# Altium footprint library THU.PcbLib: 477 footprints (part 8 of 30)
Each footprint in its own frame and in the unit in brackets; x right, y up, seen from the top. Pads: shape width x height; smd on the part's side, far side on the other; paste and mask are expansions set on the pad; w line width, h text height; cw(c..) or ccw(c..) is an arc to the next point about the centre after c.
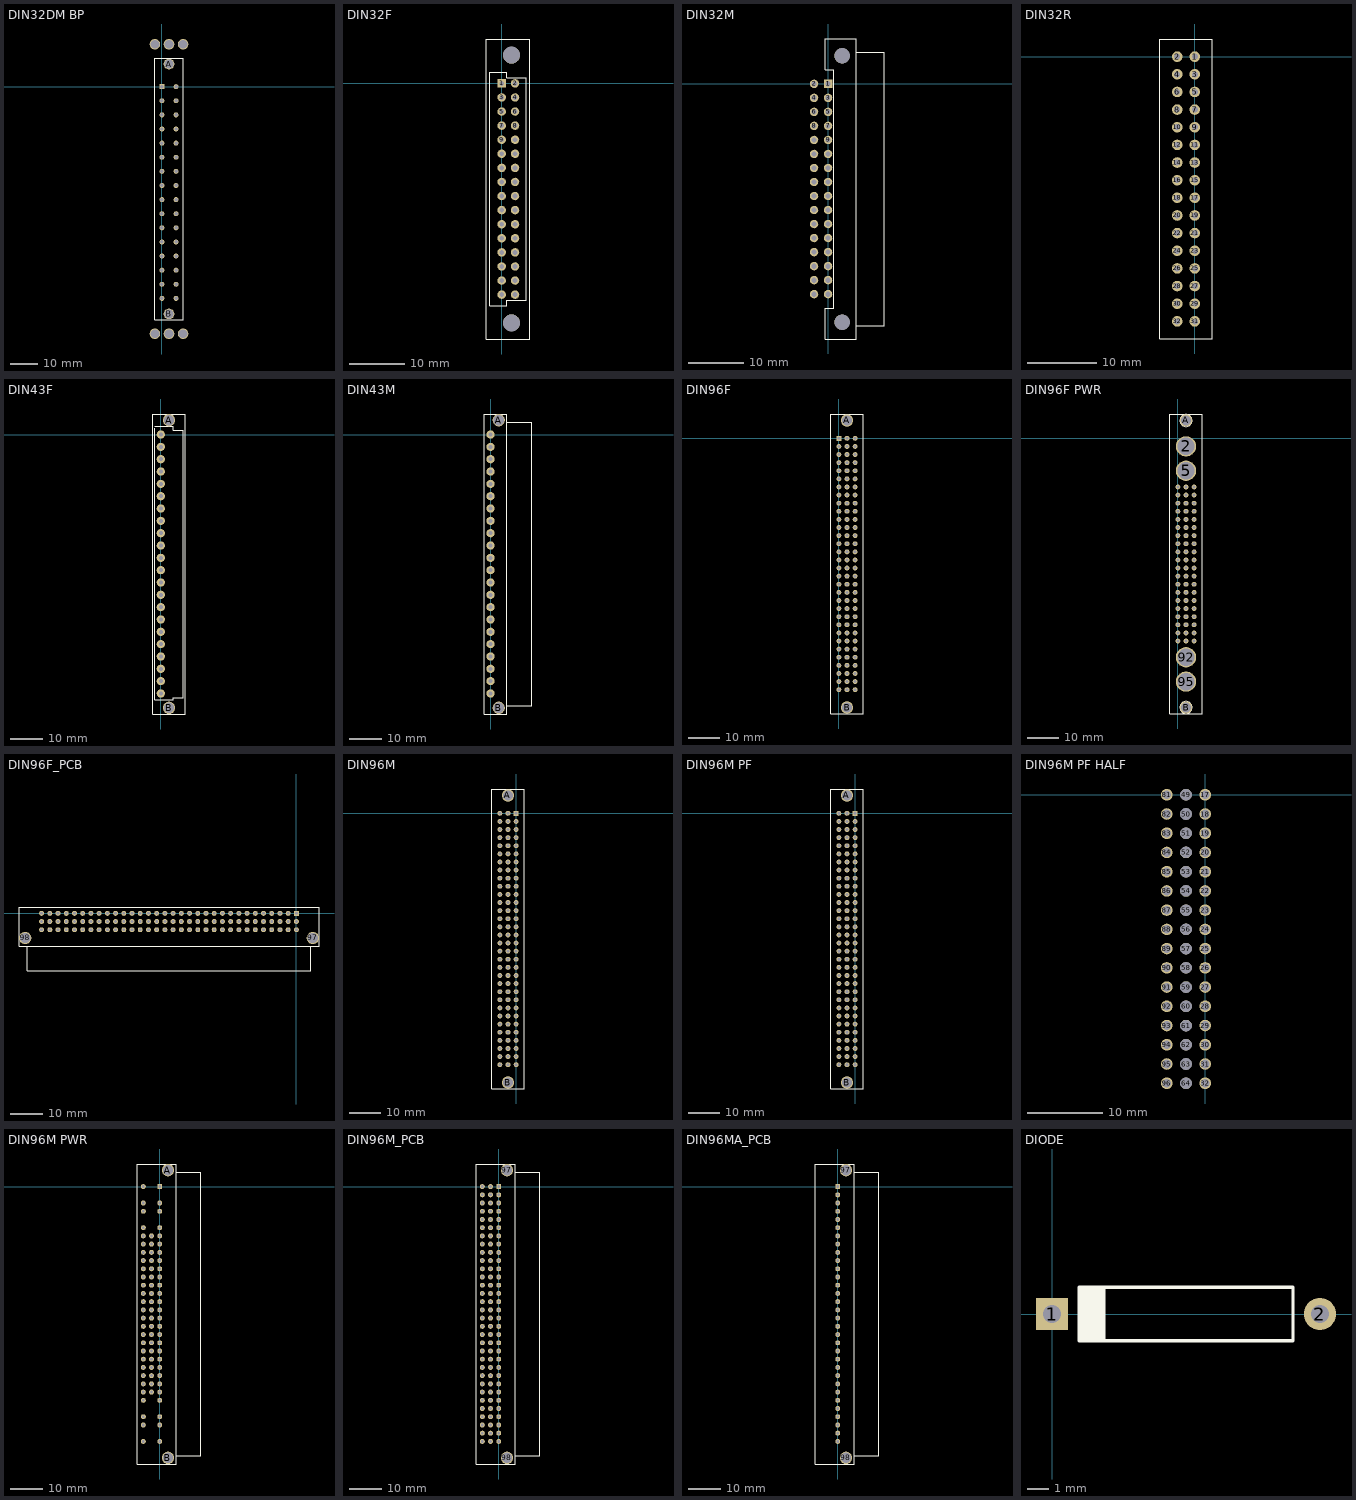
[diagram p7: the footprints below, top view; thin cyan lines are the x and y axes]

## DIN32DM BP [mil]
pads (40):
  rect 70x70 hole 49: 2(0,0)
  round 70 hole 49: 4(0,-200) 6(0,-400) 8(0,-600) 10(0,-800) 12(0,-1000) 14(0,-1200) 16(0,-1400) 18(0,-1600) 20(0,-1800) 22(0,-2000) 24(0,-2200) 26(0,-2400) 28(0,-2600) 30(0,-2800) 32(0,-3000) 66(200,0) 68(200,-200) 70(200,-400) 72(200,-600) 74(200,-800) 76(200,-1000) 78(200,-1200) 80(200,-1400) 82(200,-1600) 84(200,-1800) 86(200,-2000) 88(200,-2200) 90(200,-2400) 92(200,-2600) 94(200,-2800) 96(200,-3000)
  round 150 hole 125: A(100,320) B(100,-3220) ""(-100,-3500) ""(-100,600) ""(100,-3500) ""(100,600) ""(300,-3500) ""(300,600)
TopOverlay:
  lines w6: -100,-3300 -100,400 300,400 300,-3300 -100,-3300
BottomOverlay:
  circle w6: c100,600 r62
  circle w6: c100,-3500 r62
  circle w6: c100,320 r62
  circle w6: c100,-3220 r62

## DIN32F [mil]
pads (34):
  rect 60x60 hole 34: 1(0,0)
  round 60 hole 34: 2(95,0) 3(0,-100) 4(95,-100) 5(0,-200) 6(95,-200) 7(0,-300) 8(95,-300) 9(0,-400) 10(95,-400) 11(0,-500) 12(95,-500) 13(0,-600) 14(95,-600) 15(0,-700) 16(95,-700) 17(0,-800) 18(95,-800) 19(0,-900) 20(95,-900) 21(0,-1000) 22(95,-1000) 23(0,-1100) 24(95,-1100) 25(0,-1200) 26(95,-1200) 27(0,-1300) 28(95,-1300) 29(0,-1400) 30(95,-1400) 31(0,-1500) 32(95,-1500)
  round 120 hole 120: ""(70,-1700) ""(70,200)
TopOverlay:
  lines w6: -110,-1815 -110,315 200,315 200,-1815 -110,-1815 ; -85,-1580 -85,80 35,80 35,40 175,40 175,-1540 35,-1540 35,-1580 -85,-1580

## DIN32M [mil]
pads (34):
  rect 60x60 hole 38: 1(0,0)
  round 60 hole 38: 2(-100,0) 3(0,-100) 4(-100,-100) 5(0,-200) 6(-100,-200) 7(0,-300) 8(-100,-300) 9(0,-400) 10(-100,-400) 11(0,-500) 12(-100,-500) 13(0,-600) 14(-100,-600) 15(0,-700) 16(-100,-700) 17(0,-800) 18(-100,-800) 19(0,-900) 20(-100,-900) 21(0,-1000) 22(-100,-1000) 23(0,-1100) 24(-100,-1100) 25(0,-1200) 26(-100,-1200) 27(0,-1300) 28(-100,-1300) 29(0,-1400) 30(-100,-1400) 31(0,-1500) 32(-100,-1500)
  round 109 hole 110: ""(100,-1700) ""(100,200)
TopOverlay:
  lines w6: 200,-1725 400,-1725 400,225 200,225 ; -20,-1820 200,-1820 200,320 -20,320 -20,100 40,100 40,-1600 -20,-1600 -20,-1820

## DIN32R [mil]
pads (32):
  round 60 hole 34: 1(0,0) 2(-100,0) 3(0,-100) 4(-100,-100) 5(0,-200) 6(-100,-200) 7(0,-300) 8(-100,-300) 9(0,-400) 10(-100,-400) 11(0,-500) 12(-100,-500) 13(0,-600) 14(-100,-600) 15(0,-700) 16(-100,-700) 17(0,-800) 18(-100,-800) 19(0,-900) 20(-100,-900) 21(0,-1000) 22(-100,-1000) 23(0,-1100) 24(-100,-1100) 25(0,-1200) 26(-100,-1200) 27(0,-1300) 28(-100,-1300) 29(0,-1400) 30(-100,-1400) 31(0,-1500) 32(-100,-1500)
TopOverlay:
  lines w6: -200,-1600 100,-1600 100,100 -200,100 -200,-1600

## DIN43F [mil]
pads (24):
  round 100 hole 49: 22(0,0) 23(0,-150) 24(0,-300) 25(0,-450) 26(0,-600) 27(0,-750) 28(0,-900) 29(0,-1050) 30(0,-1200) 31(0,-1350) 32(0,-1500) 33(0,-1650) 34(0,-1800) 35(0,-1950) 36(0,-2100) 37(0,-2250) 38(0,-2400) 39(0,-2550) 40(0,-2700) 41(0,-2850) 42(0,-3000) 43(0,-3150)
  round 150 hole 125: A(100,175) B(100,-3325)
TopOverlay:
  lines w6: -75,75 -75,-3225 150,-3225 150,-3200 275,-3200 275,50 150,50 150,100 -75,100 ; -100,-3400 -100,250 300,250 300,-3400 -100,-3400

## DIN43M [mil]
pads (24):
  round 100 hole 49: 22(0,0) 23(0,-150) 24(0,-300) 25(0,-450) 26(0,-600) 27(0,-750) 28(0,-900) 29(0,-1050) 30(0,-1200) 31(0,-1350) 32(0,-1500) 33(0,-1650) 34(0,-1800) 35(0,-1950) 36(0,-2100) 37(0,-2250) 38(0,-2400) 39(0,-2550) 40(0,-2700) 41(0,-2850) 42(0,-3000) 43(0,-3150)
  round 150 hole 125: A(100,175) B(100,-3325)
TopOverlay:
  lines w6: 200,-3300 500,-3300 500,150 200,150 ; -75,-3400 200,-3400 200,250 -75,250 -75,-3400

## DIN96F [mil]
pads (98):
  rect 60x60 hole 34: 1(0,0)
  round 60 hole 34: 2(0,-100) 3(0,-200) 4(0,-300) 5(0,-400) 6(0,-500) 7(0,-600) 8(0,-700) 9(0,-800) 10(0,-900) 11(0,-1000) 12(0,-1100) 13(0,-1200) 14(0,-1300) 15(0,-1400) 16(0,-1500) 17(0,-1600) 18(0,-1700) 19(0,-1800) 20(0,-1900) 21(0,-2000) 22(0,-2100) 23(0,-2200) 24(0,-2300) 25(0,-2400) 26(0,-2500) 27(0,-2600) 28(0,-2700) 29(0,-2800) 30(0,-2900) 31(0,-3000) 32(0,-3100) 33(100,0) 34(100,-100) 35(100,-200) 36(100,-300) 37(100,-400) 38(100,-500) 39(100,-600) 40(100,-700) 41(100,-800) 42(100,-900) 43(100,-1000) 44(100,-1100) 45(100,-1200) 46(100,-1300) 47(100,-1400) 48(100,-1500) 49(100,-1600) 50(100,-1700) 51(100,-1800) 52(100,-1900) 53(100,-2000) 54(100,-2100) 55(100,-2200) 56(100,-2300) 57(100,-2400) 58(100,-2500) 59(100,-2600) 60(100,-2700) 61(100,-2800) 62(100,-2900) 63(100,-3000) 64(100,-3100) 65(200,0) 66(200,-100) 67(200,-200) 68(200,-300) 69(200,-400) 70(200,-500) 71(200,-600) 72(200,-700) 73(200,-800) 74(200,-900) 75(200,-1000) 76(200,-1100) 77(200,-1200) 78(200,-1300) 79(200,-1400) 80(200,-1500) 81(200,-1600) 82(200,-1700) 83(200,-1800) 84(200,-1900) 85(200,-2000) 86(200,-2100) 87(200,-2200) 88(200,-2300) 89(200,-2400) 90(200,-2500) 91(200,-2600) 92(200,-2700) 93(200,-2800) 94(200,-2900) 95(200,-3000) 96(200,-3100)
  round 150 hole 125: A(100,220) B(100,-3320)
TopOverlay:
  circle w6: c100,-3320 r62
  circle w6: c100,220 r62
  lines w6: -100,-3400 -100,300 300,300 300,-3400 -100,-3400

## DIN96F PWR [mil]
pads (66):
  round 250 hole 215: 2(100,-100) 5(100,-400) 92(100,-2700) 95(100,-3000)
  round 60 hole 34: 7(0,-600) 8(0,-700) 9(0,-800) 10(0,-900) 11(0,-1000) 12(0,-1100) 13(0,-1200) 14(0,-1300) 15(0,-1400) 16(0,-1500) 17(0,-1600) 18(0,-1700) 19(0,-1800) 20(0,-1900) 21(0,-2000) 22(0,-2100) 23(0,-2200) 24(0,-2300) 25(0,-2400) 26(0,-2500) 39(100,-600) 40(100,-700) 41(100,-800) 42(100,-900) 43(100,-1000) 44(100,-1100) 45(100,-1200) 46(100,-1300) 47(100,-1400) 48(100,-1500) 49(100,-1600) 50(100,-1700) 51(100,-1800) 52(100,-1900) 53(100,-2000) 54(100,-2100) 55(100,-2200) 56(100,-2300) 57(100,-2400) 58(100,-2500) 71(200,-600) 72(200,-700) 73(200,-800) 74(200,-900) 75(200,-1000) 76(200,-1100) 77(200,-1200) 78(200,-1300) 79(200,-1400) 80(200,-1500) 81(200,-1600) 82(200,-1700) 83(200,-1800) 84(200,-1900) 85(200,-2000) 86(200,-2100) 87(200,-2200) 88(200,-2300) 89(200,-2400) 90(200,-2500)
  round 150 hole 125: A(100,220) B(100,-3320)
TopOverlay:
  circle w6: c100,-3320 r75
  circle w6: c100,220 r75
  lines w6: -100,-3400 -100,300 300,300 300,-3400 -100,-3400

## DIN96F_PCB [mil]
pads (98):
  rect 60x60 hole 34: 1(0,0)
  round 60 hole 34: 2(-100,0) 3(-200,0) 4(-300,0) 5(-400,0) 6(-500,0) 7(-600,0) 8(-700,0) 9(-800,0) 10(-900,0) 11(-1000,0) 12(-1100,0) 13(-1200,0) 14(-1300,0) 15(-1400,0) 16(-1500,0) 17(-1600,0) 18(-1700,0) 19(-1800,0) 20(-1900,0) 21(-2000,0) 22(-2100,0) 23(-2200,0) 24(-2300,0) 25(-2400,0) 26(-2500,0) 27(-2600,0) 28(-2700,0) 29(-2800,0) 30(-2900,0) 31(-3000,0) 32(-3100,0) 33(0,-100) 34(-100,-100) 35(-200,-100) 36(-300,-100) 37(-400,-100) 38(-500,-100) 39(-600,-100) 40(-700,-100) 41(-800,-100) 42(-900,-100) 43(-1000,-100) 44(-1100,-100) 45(-1200,-100) 46(-1300,-100) 47(-1400,-100) 48(-1500,-100) 49(-1600,-100) 50(-1700,-100) 51(-1800,-100) 52(-1900,-100) 53(-2000,-100) 54(-2100,-100) 55(-2200,-100) 56(-2300,-100) 57(-2400,-100) 58(-2500,-100) 59(-2600,-100) 60(-2700,-100) 61(-2800,-100) 62(-2900,-100) 63(-3000,-100) 64(-3100,-100) 65(0,-200) 66(-100,-200) 67(-200,-200) 68(-300,-200) 69(-400,-200) 70(-500,-200) 71(-600,-200) 72(-700,-200) 73(-800,-200) 74(-900,-200) 75(-1000,-200) 76(-1100,-200) 77(-1200,-200) 78(-1300,-200) 79(-1400,-200) 80(-1500,-200) 81(-1600,-200) 82(-1700,-200) 83(-1800,-200) 84(-1900,-200) 85(-2000,-200) 86(-2100,-200) 87(-2200,-200) 88(-2300,-200) 89(-2400,-200) 90(-2500,-200) 91(-2600,-200) 92(-2700,-200) 93(-2800,-200) 94(-2900,-200) 95(-3000,-200) 96(-3100,-200)
  round 150 hole 125: 97(200,-300) 98(-3300,-300)
TopOverlay:
  lines w6: -3275,-400 -3275,-700 175,-700 175,-400 ; -3375,-400 -3375,75 275,75 275,-400 -3375,-400

## DIN96M [mil]
pads (98):
  rect 60x60 hole 34: 1(0,0)
  round 60 hole 34: 2(0,-100) 3(0,-200) 4(0,-300) 5(0,-400) 6(0,-500) 7(0,-600) 8(0,-700) 9(0,-800) 10(0,-900) 11(0,-1000) 12(0,-1100) 13(0,-1200) 14(0,-1300) 15(0,-1400) 16(0,-1500) 17(0,-1600) 18(0,-1700) 19(0,-1800) 20(0,-1900) 21(0,-2000) 22(0,-2100) 23(0,-2200) 24(0,-2300) 25(0,-2400) 26(0,-2500) 27(0,-2600) 28(0,-2700) 29(0,-2800) 30(0,-2900) 31(0,-3000) 32(0,-3100) 33(-100,0) 34(-100,-100) 35(-100,-200) 36(-100,-300) 37(-100,-400) 38(-100,-500) 39(-100,-600) 40(-100,-700) 41(-100,-800) 42(-100,-900) 43(-100,-1000) 44(-100,-1100) 45(-100,-1200) 46(-100,-1300) 47(-100,-1400) 48(-100,-1500) 49(-100,-1600) 50(-100,-1700) 51(-100,-1800) 52(-100,-1900) 53(-100,-2000) 54(-100,-2100) 55(-100,-2200) 56(-100,-2300) 57(-100,-2400) 58(-100,-2500) 59(-100,-2600) 60(-100,-2700) 61(-100,-2800) 62(-100,-2900) 63(-100,-3000) 64(-100,-3100) 65(-200,0) 66(-200,-100) 67(-200,-200) 68(-200,-300) 69(-200,-400) 70(-200,-500) 71(-200,-600) 72(-200,-700) 73(-200,-800) 74(-200,-900) 75(-200,-1000) 76(-200,-1100) 77(-200,-1200) 78(-200,-1300) 79(-200,-1400) 80(-200,-1500) 81(-200,-1600) 82(-200,-1700) 83(-200,-1800) 84(-200,-1900) 85(-200,-2000) 86(-200,-2100) 87(-200,-2200) 88(-200,-2300) 89(-200,-2400) 90(-200,-2500) 91(-200,-2600) 92(-200,-2700) 93(-200,-2800) 94(-200,-2900) 95(-200,-3000) 96(-200,-3100)
  round 150 hole 125: A(-100,220) B(-100,-3320)
TopOverlay:
  circle w6: c-100,220 r62
  circle w6: c-100,-3320 r62
  lines w6: -300,-3400 100,-3400 100,300 -300,300 -300,-3400

## DIN96M PF [mil]
pads (98):
  rect 60x60 hole 39.37: 1(0,0)
  round 60 hole 39.37: 2(0,-100) 3(0,-200) 4(0,-300) 5(0,-400) 6(0,-500) 7(0,-600) 8(0,-700) 9(0,-800) 10(0,-900) 11(0,-1000) 12(0,-1100) 13(0,-1200) 14(0,-1300) 15(0,-1400) 16(0,-1500) 17(0,-1600) 18(0,-1700) 19(0,-1800) 20(0,-1900) 21(0,-2000) 22(0,-2100) 23(0,-2200) 24(0,-2300) 25(0,-2400) 26(0,-2500) 27(0,-2600) 28(0,-2700) 29(0,-2800) 30(0,-2900) 31(0,-3000) 32(0,-3100) 33(-100,0) 34(-100,-100) 35(-100,-200) 36(-100,-300) 37(-100,-400) 38(-100,-500) 39(-100,-600) 40(-100,-700) 41(-100,-800) 42(-100,-900) 43(-100,-1000) 44(-100,-1100) 45(-100,-1200) 46(-100,-1300) 47(-100,-1400) 48(-100,-1500) 49(-100,-1600) 50(-100,-1700) 51(-100,-1800) 52(-100,-1900) 53(-100,-2000) 54(-100,-2100) 55(-100,-2200) 56(-100,-2300) 57(-100,-2400) 58(-100,-2500) 59(-100,-2600) 60(-100,-2700) 61(-100,-2800) 62(-100,-2900) 63(-100,-3000) 64(-100,-3100) 65(-200,0) 66(-200,-100) 67(-200,-200) 68(-200,-300) 69(-200,-400) 70(-200,-500) 71(-200,-600) 72(-200,-700) 73(-200,-800) 74(-200,-900) 75(-200,-1000) 76(-200,-1100) 77(-200,-1200) 78(-200,-1300) 79(-200,-1400) 80(-200,-1500) 81(-200,-1600) 82(-200,-1700) 83(-200,-1800) 84(-200,-1900) 85(-200,-2000) 86(-200,-2100) 87(-200,-2200) 88(-200,-2300) 89(-200,-2400) 90(-200,-2500) 91(-200,-2600) 92(-200,-2700) 93(-200,-2800) 94(-200,-2900) 95(-200,-3000) 96(-200,-3100)
  round 150 hole 125: A(-100,220) B(-100,-3320)
TopOverlay:
  circle w6: c-100,220 r62
  circle w6: c-100,-3320 r62
  lines w6: -300,-3400 100,-3400 100,300 -300,300 -300,-3400

## DIN96M PF HALF [mil]
pads (48):
  round 60 hole 45: 17(0,0) 18(0,-100) 19(0,-200) 20(0,-300) 21(0,-400) 22(0,-500) 23(0,-600) 24(0,-700) 25(0,-800) 26(0,-900) 27(0,-1000) 28(0,-1100) 29(0,-1200) 30(0,-1300) 31(0,-1400) 32(0,-1500) 81(-200,0) 82(-200,-100) 83(-200,-200) 84(-200,-300) 85(-200,-400) 86(-200,-500) 87(-200,-600) 88(-200,-700) 89(-200,-800) 90(-200,-900) 91(-200,-1000) 92(-200,-1100) 93(-200,-1200) 94(-200,-1300) 95(-200,-1400) 96(-200,-1500)
  round 60 hole 60 unplated: 49(-100,0) 50(-100,-100) 51(-100,-200) 52(-100,-300) 53(-100,-400) 54(-100,-500) 55(-100,-600) 56(-100,-700) 57(-100,-800) 58(-100,-900) 59(-100,-1000) 60(-100,-1100) 61(-100,-1200) 62(-100,-1300) 63(-100,-1400) 64(-100,-1500)

## DIN96M PWR [mil]
pads (78):
  rect 60x60 hole 34: 1(0,0)
  round 60 hole 34: 3(0,-200) 4(0,-300) 6(0,-500) 7(0,-600) 8(0,-700) 9(0,-800) 10(0,-900) 11(0,-1000) 12(0,-1100) 13(0,-1200) 14(0,-1300) 15(0,-1400) 16(0,-1500) 17(0,-1600) 18(0,-1700) 19(0,-1800) 20(0,-1900) 21(0,-2000) 22(0,-2100) 23(0,-2200) 24(0,-2300) 25(0,-2400) 26(0,-2500) 27(0,-2600) 29(0,-2800) 30(0,-2900) 32(0,-3100) 39(-100,-600) 40(-100,-700) 41(-100,-800) 42(-100,-900) 43(-100,-1000) 44(-100,-1100) 45(-100,-1200) 46(-100,-1300) 47(-100,-1400) 48(-100,-1500) 49(-100,-1600) 50(-100,-1700) 51(-100,-1800) 52(-100,-1900) 53(-100,-2000) 54(-100,-2100) 55(-100,-2200) 56(-100,-2300) 57(-100,-2400) 58(-100,-2500) 65(-200,0) 67(-200,-200) 68(-200,-300) 70(-200,-500) 71(-200,-600) 72(-200,-700) 73(-200,-800) 74(-200,-900) 75(-200,-1000) 76(-200,-1100) 77(-200,-1200) 78(-200,-1300) 79(-200,-1400) 80(-200,-1500) 81(-200,-1600) 82(-200,-1700) 83(-200,-1800) 84(-200,-1900) 85(-200,-2000) 86(-200,-2100) 87(-200,-2200) 88(-200,-2300) 89(-200,-2400) 90(-200,-2500) 91(-200,-2600) 93(-200,-2800) 94(-200,-2900) 96(-200,-3100)
  round 150 hole 125: A(100,200) B(100,-3300)
TopOverlay:
  lines w6: 200,-3275 500,-3275 500,175 200,175 ; -275,-3375 200,-3375 200,275 -275,275 -275,-3375

## DIN96M_PCB [mil]
pads (98):
  rect 60x60 hole 34: 1(0,0)
  round 60 hole 34: 2(0,-100) 3(0,-200) 4(0,-300) 5(0,-400) 6(0,-500) 7(0,-600) 8(0,-700) 9(0,-800) 10(0,-900) 11(0,-1000) 12(0,-1100) 13(0,-1200) 14(0,-1300) 15(0,-1400) 16(0,-1500) 17(0,-1600) 18(0,-1700) 19(0,-1800) 20(0,-1900) 21(0,-2000) 22(0,-2100) 23(0,-2200) 24(0,-2300) 25(0,-2400) 26(0,-2500) 27(0,-2600) 28(0,-2700) 29(0,-2800) 30(0,-2900) 31(0,-3000) 32(0,-3100) 33(-100,0) 34(-100,-100) 35(-100,-200) 36(-100,-300) 37(-100,-400) 38(-100,-500) 39(-100,-600) 40(-100,-700) 41(-100,-800) 42(-100,-900) 43(-100,-1000) 44(-100,-1100) 45(-100,-1200) 46(-100,-1300) 47(-100,-1400) 48(-100,-1500) 49(-100,-1600) 50(-100,-1700) 51(-100,-1800) 52(-100,-1900) 53(-100,-2000) 54(-100,-2100) 55(-100,-2200) 56(-100,-2300) 57(-100,-2400) 58(-100,-2500) 59(-100,-2600) 60(-100,-2700) 61(-100,-2800) 62(-100,-2900) 63(-100,-3000) 64(-100,-3100) 65(-200,0) 66(-200,-100) 67(-200,-200) 68(-200,-300) 69(-200,-400) 70(-200,-500) 71(-200,-600) 72(-200,-700) 73(-200,-800) 74(-200,-900) 75(-200,-1000) 76(-200,-1100) 77(-200,-1200) 78(-200,-1300) 79(-200,-1400) 80(-200,-1500) 81(-200,-1600) 82(-200,-1700) 83(-200,-1800) 84(-200,-1900) 85(-200,-2000) 86(-200,-2100) 87(-200,-2200) 88(-200,-2300) 89(-200,-2400) 90(-200,-2500) 91(-200,-2600) 92(-200,-2700) 93(-200,-2800) 94(-200,-2900) 95(-200,-3000) 96(-200,-3100)
  round 150 hole 125: 97(100,200) 98(100,-3300)
TopOverlay:
  lines w6: 200,-3275 500,-3275 500,175 200,175 ; -275,-3375 -275,275 200,275 200,-3375 -275,-3375

## DIN96MA_PCB [mil]
pads (34):
  rect 60x60 hole 34: 1(0,0)
  round 60 hole 34: 2(0,-100) 3(0,-200) 4(0,-300) 5(0,-400) 6(0,-500) 7(0,-600) 8(0,-700) 9(0,-800) 10(0,-900) 11(0,-1000) 12(0,-1100) 13(0,-1200) 14(0,-1300) 15(0,-1400) 16(0,-1500) 17(0,-1600) 18(0,-1700) 19(0,-1800) 20(0,-1900) 21(0,-2000) 22(0,-2100) 23(0,-2200) 24(0,-2300) 25(0,-2400) 26(0,-2500) 27(0,-2600) 28(0,-2700) 29(0,-2800) 30(0,-2900) 31(0,-3000) 32(0,-3100)
  round 150 hole 125: 97(100,200) 98(100,-3300)
TopOverlay:
  lines w6: 200,-3275 500,-3275 500,175 200,175 ; -275,-3375 200,-3375 200,275 -275,275 -275,-3375

## DIODE [mil]
pads (2):
  rect 60x60 hole 34: 1(0,0)
  round 60 hole 34: 2(500,0)
TopOverlay:
  rectangle: 50,-50 100,50
  lines w6: 50,-50 50,50 450,50 450,-50 50,-50